# Altium footprint library DrPCB.PcbLib: 910 footprints (part 9 of 57)
Each footprint in its own frame and in the unit in brackets; x right, y up, seen from the top. Pads: shape width x height; smd on the part's side, far side on the other; paste and mask are expansions set on the pad; w line width, h text height; cw(c..) or ccw(c..) is an arc to the next point about the centre after c.
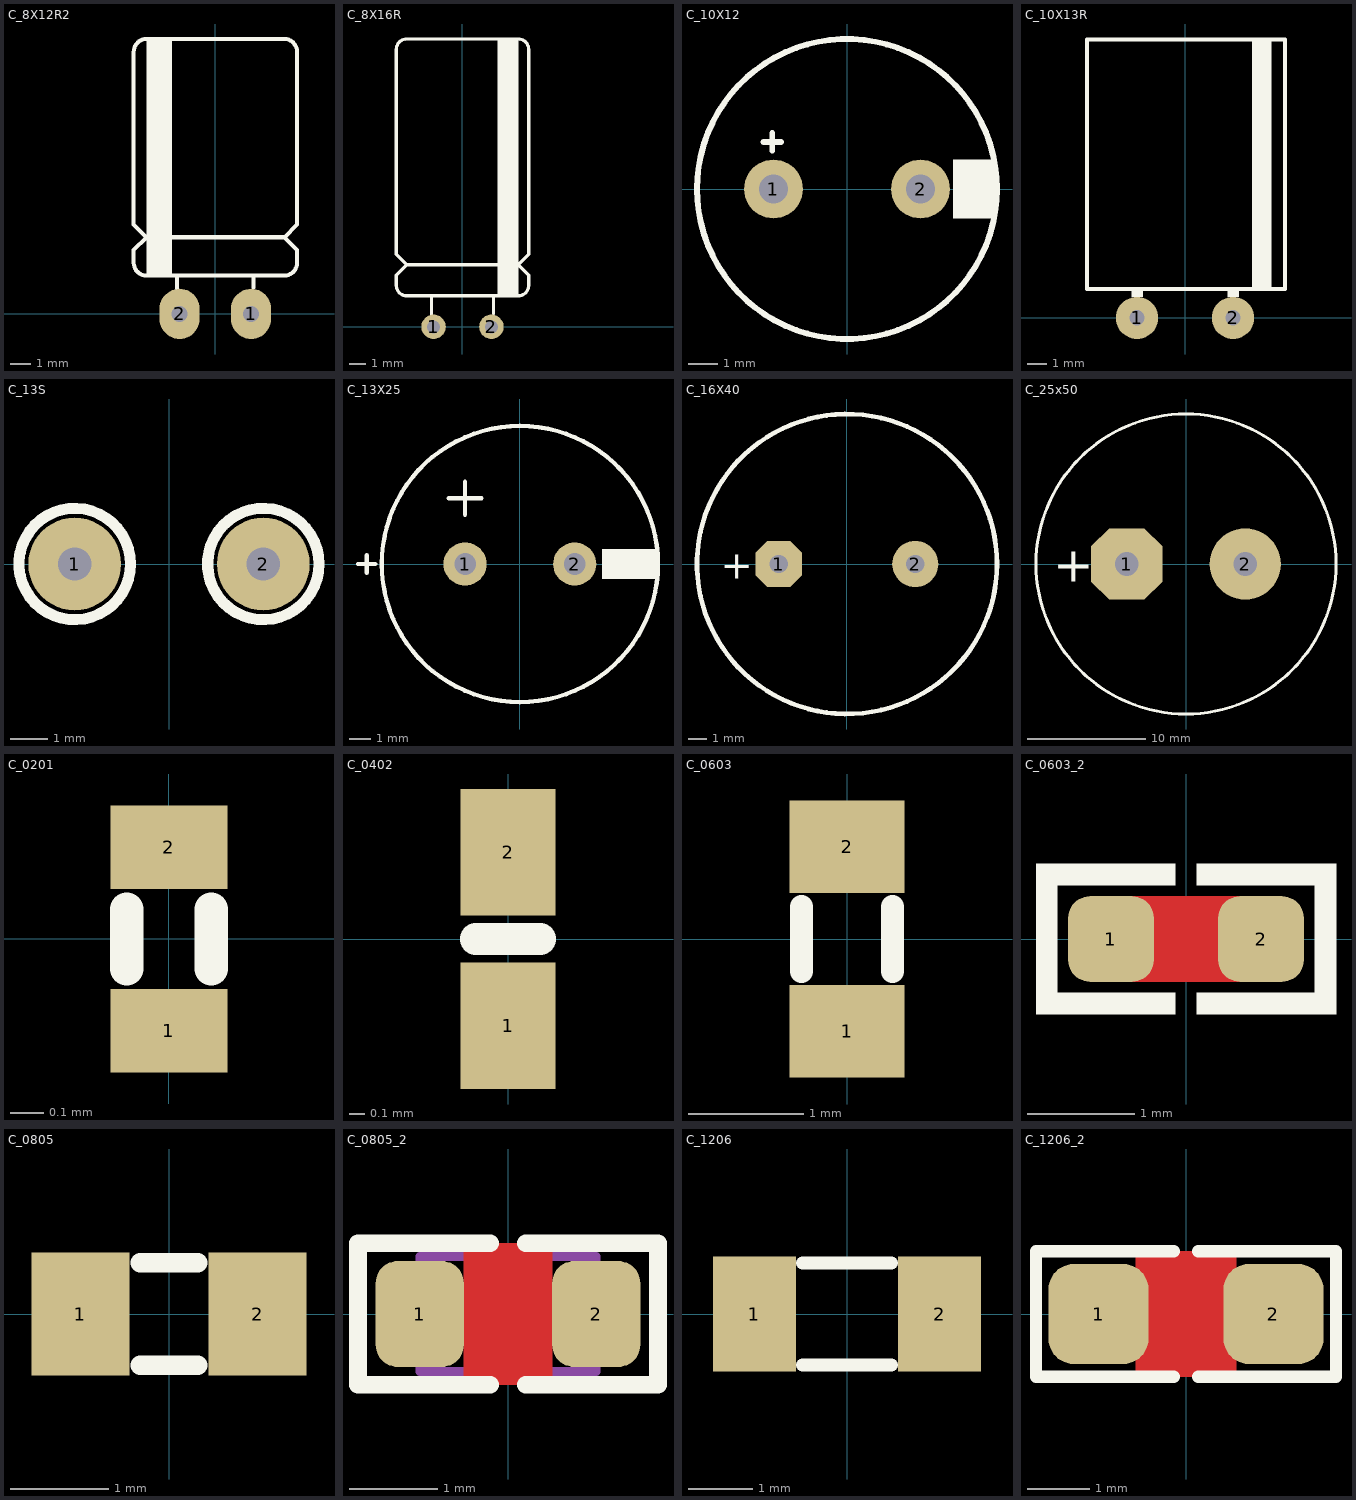
[diagram p8: the footprints below, top view; thin cyan lines are the x and y axes]

## C_8X12R2 [mm] "Cap Elec, D8.0X12.0H pitch: 3.5mm, RIGHT ANGLE"
pads (2):
  oval 2x2.5 hole 0.8: 1(1.778,0) 2(-1.778,0)
Top Overlay:
  region: -3.429,13.67 -3.429,1.905 -2.159,1.905 -2.159,13.67
  lines w0.2: -1.905,1.27 -1.905,1.905 ; 1.905,1.308 1.905,1.905 ; -3.429,3.81 -4.064,4.445 -4.064,13.035 cw(c-3.429,13.035) -3.429,13.67 3.429,13.67 cw(c3.429,13.035) 4.064,13.035 4.064,4.445 3.429,3.81 ; -3.429,3.81 -4.064,3.175 -4.064,2.54 ccw(c-3.429,2.54) -3.429,1.905 3.429,1.905 ccw(c3.429,2.54) 4.064,2.54 4.064,3.175 3.429,3.81 ; -3.429,3.81 3.429,3.81
3D body "User Library-Cap electro 8x11_5x3_5mm RA.step": height 8.03, standoff -2, extent -4.025,-0.3 4.025,13.521

## C_8X16R [mm] "Cap Elec, D8.0X12.0H pitch: 3.5mm, RIGHT ANGLE"
pads (2):
  round 1.5 hole 0.8: 1(-1.778,0) 2(1.778,0)
Top Overlay:
  region: 2.159,17.59 2.159,1.905 3.429,1.905 3.429,17.59
  lines w0.2: -4.064,17.035 -4.064,4.445 -3.429,3.81 ; -4.064,17.036 cw(c-3.429,17.036) -3.429,17.671 3.429,17.671 cw(c3.429,17.036) 4.064,17.036 ; -1.905,0.762 -1.905,1.905 ; 1.905,0.787 1.905,1.905 ; 4.064,17.035 4.064,4.445 3.429,3.81 ; -3.429,3.81 3.429,3.81 ; -3.429,3.81 -4.064,3.175 -4.064,2.54 ccw(c-3.429,2.54) -3.429,1.905 3.429,1.905 ccw(c3.429,2.54) 4.064,2.54 4.064,3.175 3.429,3.81
3D body "ElCapLA-3.5-8x16.step": height 8.1, standoff -3, extent -4,-0.249 4.001,18.001

## C_10X12 [mm] "Cap Elec, D10.0X12.0H pitch: 5.0mm"
height 12
pads (2):
  round 2 hole 1: 1(-2.5,0) 2(2.5,0)
Top Overlay:
  circle w0.2: c0,0 r5.1
  rectangle: 3.6,-1 5.1,1
  lines w0.2: -2.84,1.6 -2.24,1.6 ; -2.54,1.3 -2.54,1.9
3D body "ELE Radial 10x12.STEP": height 13.7, standoff -1.7, extent -5.069,-5.081 5.05,5.044

## C_10X13R [mm] "Cap Elec, D10.0X12.0H pitch: 5.0mm"
height 12
pads (2):
  round 2.2 hole 0.8: 1(-2.5,0) 2(2.5,0)
Top Overlay:
  rectangle: 3.5,1.5 4.5,14.529
  rectangle: -2.8,1.1 -2.2,1.5
  region: 2.8,1.5 2.2,1.5 2.2,1.1 2.8,1.1
  lines w0.2: -5.1,1.5 5.2,1.5 5.2,14.5 -5.1,14.5 -5.1,1.5

## C_13S [mm] "Cap Elec, D12.0X25.0H pitch: 5.0mm, RB.2/.5"
pads (2):
  round 2.5 hole 0.9: 1(-2.54,0) 2(2.54,0)
Top Overlay:
  circle w0.3: c2.54,0 r1.5
  circle w0.3: c-2.54,0 r1.5

## C_13X25 [mm] "Cap Elec, D12.0X25.0H pitch: 5.0mm, RB.2/.5"
pads (2):
  round 2 hole 1: 1(-2.54,0) 2(2.54,0)
Top Overlay:
  circle w0.2: c0,0 r6.4
  rectangle: 3.8,-0.7 6.4,0.7
  lines w0.2: -7.5,0 -6.7,0 ; -7.1,-0.4 -7.1,0.4 ; -3.302,3.048 -1.778,3.048 ; -2.54,2.286 -2.54,3.81
3D body "User Library-Cap-EL(12_5x25-5)T.step": height 25.8, standoff -3.2, extent -6.25,-6.273 6.252,6.211

## C_16X40 [mm]
pads (2):
  oct 2.5x2.5 hole 1: 1(-3.7,0)
  round 2.5 hole 1: 2(3.7,0)
Top Overlay:
  circle w0.254: c0,0 r8.125
  text "+" at -6.845,-0.787 h1.52
3D body "User Library-CAPAER_D160_L400_P075_W008X030.STEP": height 40.01, standoff -3, extent -8.005,-8 8.005,8

## C_25x50 [mm]
pads (2):
  oct 6x6 hole 2: 1(-5,0)
  round 6 hole 2: 2(5,0)
Top Overlay:
  circle w0.254: c0,0 r12.65
  text "+" at -11.201,-1.5 h3
3D body "User Library-JAMICON_TK_D(25)F(12_5)L(50).step": height 50.04, standoff -1.49, extent -12.515,-12.5 12.515,12.5

## C_0201 [mm]
pads (2):
  rect 0.35x0.25 smd mask+0.05: 1(0,-0.275) 2(0,0.275)
Top Overlay:
  lines w0.1: -0.127,-0.089 -0.127,0.089 ; 0.127,-0.089 0.127,0.089
3D body "User Library-SMD CAPACITOR.step": height 0.31, standoff 0.01, extent -0.15,-0.3 0.15,0.3

## C_0402 [mm]
pads (2):
  rect 0.6x0.8 smd: 1(0,-0.55) 2(0,0.55)
Top Overlay:
  lines w0.2: -0.203,0 0.203,0
3D body "User Library-SMD CAPACITOR.step": height 0.51, standoff 0.01, extent -0.25,-0.5 0.25,0.5

## C_0603 [mm]
pads (2):
  rect 1x0.8 smd paste-1: 1(0,-0.8) 2(0,0.8)
Top Overlay:
  lines w0.2: -0.394,-0.279 -0.394,0.279 ; 0.394,-0.279 0.394,0.279
Top Paste:
  region: -0.35,0.8 -0.35,0.73 -0.297,0.602 -0.198,0.503 -0.07,0.45 0,0.45 0.07,0.45 0.198,0.503 0.297,0.602 0.35,0.73 0.35,0.8 0.35,1 0.35,1.03 0.327,1.085 0.285,1.127 0.23,1.15 0.2,1.15 -0.2,1.15 -0.23,1.15 -0.285,1.127 -0.327,1.085 -0.35,1.03 -0.35,1
  region: -0.35,-0.8 -0.35,-0.73 -0.297,-0.602 -0.198,-0.503 -0.07,-0.45 0,-0.45 0.07,-0.45 0.198,-0.503 0.297,-0.602 0.35,-0.73 0.35,-0.8 0.35,-1 0.35,-1.03 0.327,-1.085 0.285,-1.127 0.23,-1.15 0.2,-1.15 -0.2,-1.15 -0.23,-1.15 -0.285,-1.127 -0.327,-1.085 -0.35,-1.03 -0.35,-1
3D body "User Library-SMD CAPACITOR.STEP": height 0.81, standoff 0.01, extent -0.4,-0.8 0.4,0.8

## C_0603_2 [mm] "CHIP Capacitor, 1.6X0.8mm, 0603 OPTIMIZED"
height 0.6
pads (2):
  rrect50% 0.8x0.8 smd paste-5 mask+0.075: 1(-0.7,0) 2(0.7,0)
Top Layer:
  pour cut-out: -0.5,0.4 0.5,0.4 0.5,-0.4 -0.5,-0.4
Top Overlay:
  region: 0.1,-0.5 0.1,-0.7 1.4,-0.7 1.4,-0.5
  region: 0.1,0.5 0.1,0.7 1.4,0.7 1.4,0.5
  region: 1.4,0.7 1.2,0.7 1.2,-0.7 1.4,-0.7
  region: -1.4,0.7 -1.2,0.7 -1.2,-0.7 -1.4,-0.7
  region: -0.1,0.5 -0.1,0.7 -1.4,0.7 -1.4,0.5
  region: -0.1,-0.5 -0.1,-0.7 -1.4,-0.7 -1.4,-0.5
Top Paste:
  region: -0.7,0.35 -0.63,0.35 -0.502,0.297 -0.403,0.198 -0.35,0.07 -0.35,0 -0.35,-0.07 -0.403,-0.198 -0.502,-0.297 -0.63,-0.35 -0.7,-0.35 -0.9,-0.35 -0.93,-0.35 -0.985,-0.327 -1.027,-0.285 -1.05,-0.23 -1.05,-0.2 -1.05,0.2 -1.05,0.23 -1.027,0.285 -0.985,0.327 -0.93,0.35 -0.9,0.35
  region: 0.7,0.35 0.63,0.35 0.502,0.297 0.403,0.198 0.35,0.07 0.35,0 0.35,-0.07 0.403,-0.198 0.502,-0.297 0.63,-0.35 0.7,-0.35 0.9,-0.35 0.93,-0.35 0.985,-0.327 1.027,-0.285 1.05,-0.23 1.05,-0.2 1.05,0.2 1.05,0.23 1.027,0.285 0.985,0.327 0.93,0.35 0.9,0.35
3D body "User Library-CAPC1608X09.step": height 0.9, standoff 0, extent -0.8,-0.4 0.8,0.4

## C_0805 [mm]
pads (2):
  rect 1x1.25 smd: 1(-0.9,0) 2(0.9,0)
Top Overlay:
  lines w0.2: -0.292,-0.521 0.292,-0.521 ; -0.292,0.521 0.292,0.521
3D body "User Library-SMD CAPACITOR.STEP": height 0.67, standoff 0.07, extent -1,-0.625 1,0.625

## C_0805_2 [mm] "CHIP Capacitor, 2.0X1.3mm, 0805"
pads (2):
  rrect50% 1x1.2 smd paste-5 mask+0.075: 1(-1,0) 2(1,0)
Top Layer:
  pour cut-out: -0.5,0.8 0.5,0.8 0.5,-0.8 -0.5,-0.8
Top Overlay:
  lines w0.2: -0.2,-0.8 -1.7,-0.8 -1.7,0.8 -0.2,0.8 ; 0.2,-0.8 1.7,-0.8 1.7,0.8 0.2,0.8
Top Paste:
  region: 0.9,0.5 0.82,0.5 0.673,0.439 0.561,0.327 0.5,0.18 0.5,0.1 0.5,-0.1 0.5,-0.18 0.561,-0.327 0.673,-0.439 0.82,-0.5 0.9,-0.5 1.15,-0.5 1.18,-0.5 1.235,-0.477 1.277,-0.435 1.3,-0.38 1.3,-0.35 1.3,0.35 1.3,0.38 1.277,0.435 1.235,0.477 1.18,0.5 1.15,0.5
  region: -0.9,0.5 -0.82,0.5 -0.673,0.439 -0.561,0.327 -0.5,0.18 -0.5,0.1 -0.5,-0.1 -0.5,-0.18 -0.561,-0.327 -0.673,-0.439 -0.82,-0.5 -0.9,-0.5 -1.15,-0.5 -1.18,-0.5 -1.235,-0.477 -1.277,-0.435 -1.3,-0.38 -1.3,-0.35 -1.3,0.35 -1.3,0.38 -1.277,0.435 -1.235,0.477 -1.18,0.5 -1.15,0.5
Mechanical 13:
  lines w0.1: -1,-0.65 1,-0.65 1,0.65 -1,0.65 -1,-0.65
3D body "User Library-CAPC2013X10.step": height 1, standoff 0, extent -1,-0.625 1,0.625

## C_1206 [mm]
pads (2):
  rect 1.3x1.8 smd: 1(-1.45,0) 2(1.45,0)
Top Overlay:
  lines w0.2: -0.699,-0.8 0.699,-0.8 ; -0.699,0.8 0.699,0.8
3D body "c1206c102j5gactu.STEP": height 0.89, standoff 0.01, extent -1.7,-0.9 1.7,0.9

## C_1206_2 [mm] "CHIP Capacitor, 3.2X1.6mm, 1206"
height 2
pads (2):
  rrect50% 1.6x1.6 smd paste-5 mask+0.075: 1(-1.4,0) 2(1.4,0)
Top Layer:
  pour cut-out: -0.8,1 -0.8,-1 0.8,-1 0.8,1
Top Overlay:
  lines w0.2: -0.2,-1 -2.4,-1 -2.4,1 -0.2,1 ; 0.2,-1 2.4,-1 2.4,1 0.2,1
Top Paste:
  region: 1.4,0.7
  region: 1.4,0.7
  region: 1.4,0.7
  region: 1.15,0.7 1.1,0.7 1.008,0.662 0.938,0.592 0.9,0.5 0.9,0.45 0.9,-0.45 0.9,-0.5 0.938,-0.592 1.008,-0.662 1.1,-0.7 1.15,-0.7 1.625,-0.7 1.68,-0.7 1.781,-0.658 1.858,-0.581 1.9,-0.48 1.9,-0.425 1.9,0.45 1.9,0.5 1.862,0.592 1.792,0.662 1.7,0.7 1.65,0.7
  region: -1.15,0.7 -1.1,0.7 -1.008,0.662 -0.938,0.592 -0.9,0.5 -0.9,0.45 -0.9,-0.45 -0.9,-0.5 -0.938,-0.592 -1.008,-0.662 -1.1,-0.7 -1.15,-0.7 -1.625,-0.7 -1.68,-0.7 -1.781,-0.658 -1.858,-0.581 -1.9,-0.48 -1.9,-0.425 -1.9,0.45 -1.9,0.5 -1.862,0.592 -1.792,0.662 -1.7,0.7 -1.65,0.7
  region: -1.4,0.7
  region: -1.4,0.7
  region: -1.4,0.7
3D body "User Library-CAPC3216X10.step": height 1, standoff 0, extent -1.6,-0.8 1.6,0.8